# Altium footprint library User.PcbLib: 317 footprints (part 20 of 20)
Each footprint in its own frame and in the unit in brackets; x right, y up, seen from the top. Pads: shape width x height; smd on the part's side, far side on the other; paste and mask are expansions set on the pad; w line width, h text height; cw(c..) or ccw(c..) is an arc to the next point about the centre after c.
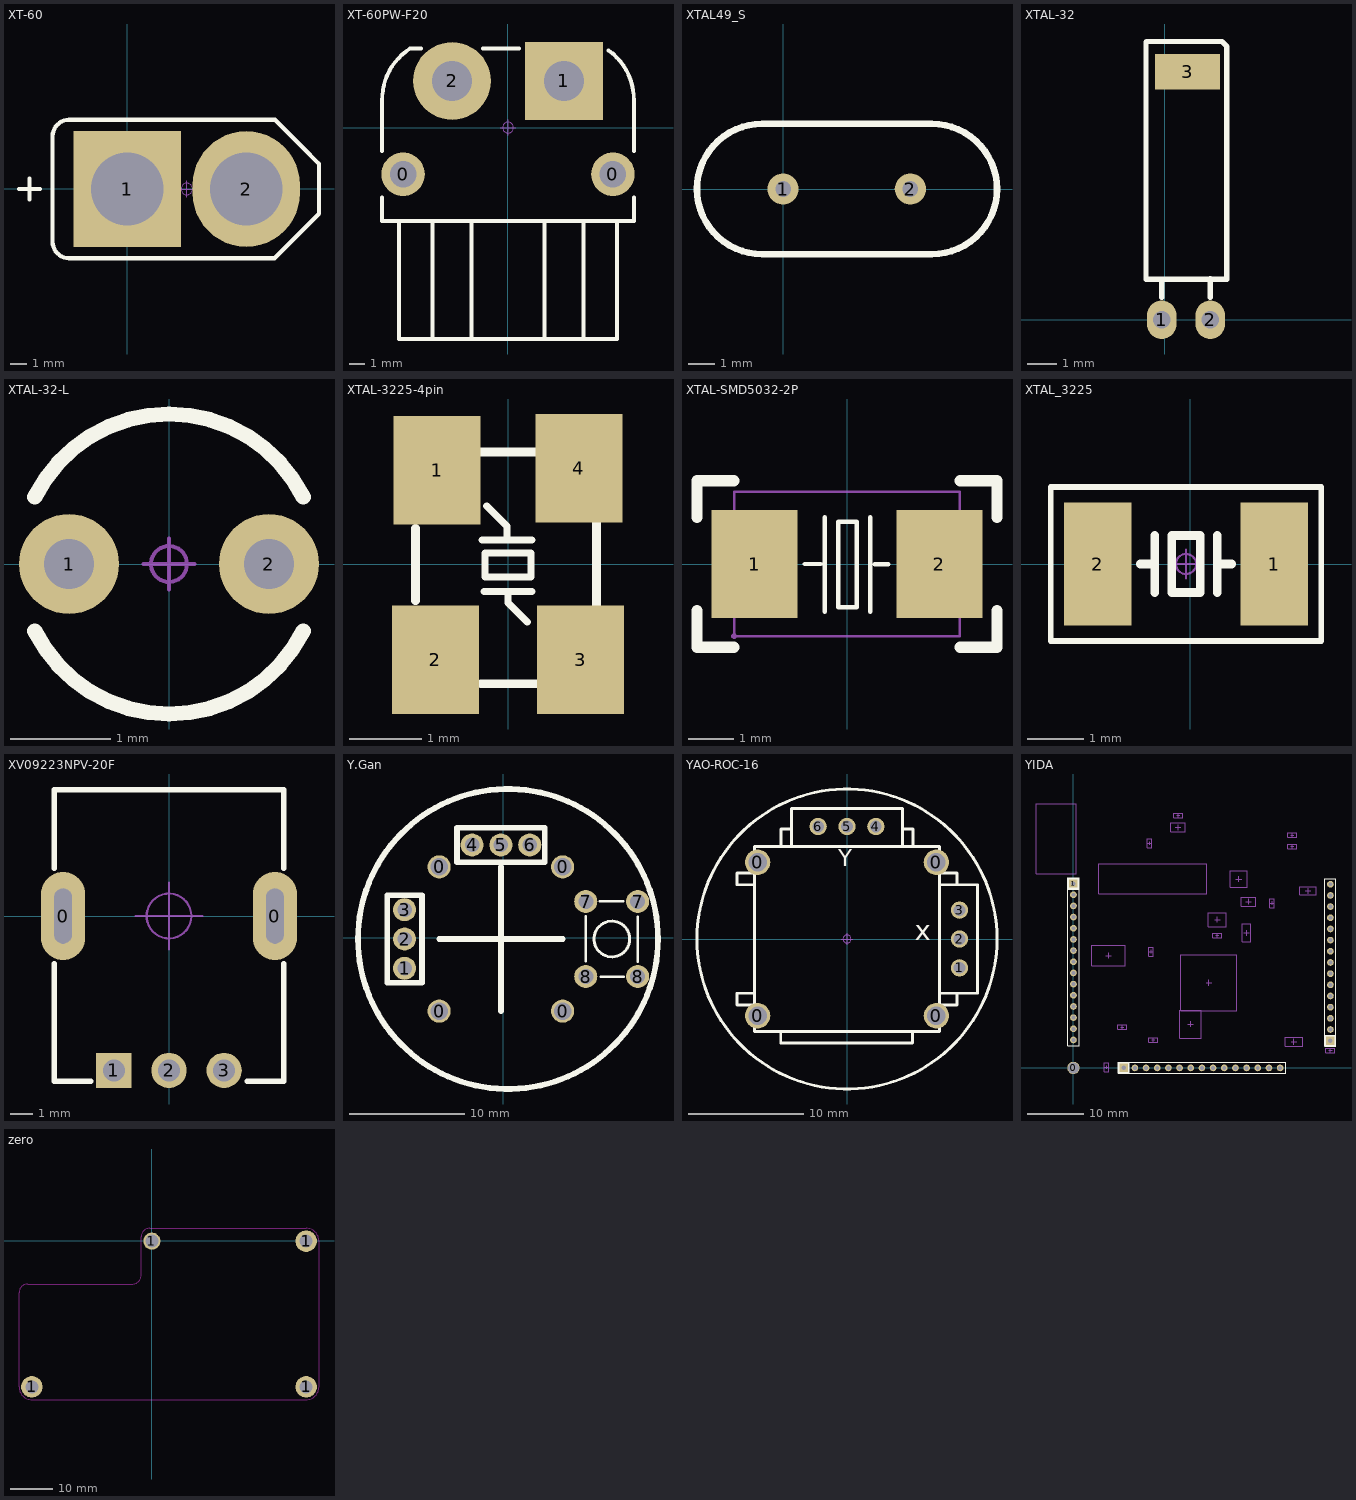
[diagram p19: the footprints below, top view; thin cyan lines are the x and y axes]

## XT-60 [mm]
pads (2):
  rect 6.5x7 hole 4.4: 1(0,-0.025)
  oval 6.5x7 hole 4.4: 2(7.2,-0.025)
Top Overlay:
  lines w0.254: -6.56,-0.025 -5.29,-0.025 ; -5.925,-0.66 -5.925,0.61 ; -4.528,-3.216 ccw(c-3.528,-3.216) -3.528,-4.216 8.909,-4.216 11.6,-1.525 11.6,1.5 10.585,2.515 8.934,4.166 -3.528,4.166 ccw(c-3.528,3.166) -4.528,3.166 -4.528,-3.216
Mechanical 15:
  circle w0.05: c3.6,-0.025 r0.35
  lines w0.05: 3.1,-0.025 4.1,-0.025 ; 3.6,-0.525 3.6,0.475
3D body "TX60-LI-S.STEP": height 16.05, standoff -2.25, extent -4.4,-4.125 11.6,4.075

## XT-60PW-F20 [mm]
pads (4):
  round 2.8 hole 1.7: 0(-6.75,-3) 0(6.75,-3)
  rect 5x5 hole 2.6: 1(3.6,3)
  round 5 hole 2.6: 2(-3.6,3)
Top Overlay:
  lines w0.254: -8.1,-4.5 -8.1,-6 8.1,-6 8.1,-4.5 ; -8.1,-1.5 -8.1,1.738 cw(c-4.2,1.8) -6.294,5.091 ; -7,-6 -7,-13.6 7,-13.6 7,-6 ; -6.294,5.1 -5.6,5.1 ; -4.85,-13.6 -4.85,-6 ; -2.35,-13.6 -2.35,-6 ; -1.6,5.1 0.7,5.1 ; 2.35,-13.6 2.35,-6 ; 4.85,-13.6 4.85,-6 ; 6.477,4.967 cw(c4.2,1.8) 8.1,1.738 ; 8.1,-1.5 8.1,1.792 ; 0,-6 ccw(c0,-6) 0,-6
Mechanical 15:
  circle w0.05: c0,0 r0.35
  lines w0.05: -0.5,0 0.5,0 ; 0,-0.5 0,0.5
3D body "TX60PW-F20.STEP": height 8.65, standoff -2.35, extent -8,-13.6 8,5.02

## XTAL49_S [mm]
pads (2):
  round 1.2 hole 0.6: 1(0,0) 2(4.88,0)
Top Overlay:
  lines w0.254: -3.3,0 ccw(c-0.8,0) -0.8,-2.5 5.7,-2.5 ccw(c5.7,0) 8.2,0 ccw(c5.7,0) 5.7,2.5 -0.8,2.5 ccw(c-0.8,0) -3.3,0
Mechanical 13:
  lines w0.025: -3.3,0 cw(c-0.8,0) -0.8,2.5 5.7,2.5 cw(c5.7,0) 8.2,0 cw(c5.7,0) 5.7,-2.5 -0.8,-2.5 cw(c-0.8,0) -3.3,0
3D body "SW3dPS-HP49US.STEP": height 4, standoff -3.5, extent -3.225,-2.32 8.125,2.33

## XTAL-32 [mm]
pads (3):
  oval 1x1.3 hole 0.6: 1(-0.1,0) 2(1.54,0)
  rect 2.2x1.2 smd: 3(0.775,8.382)
Top Overlay:
  lines w0.178: -0.1,0.762 -0.1,1.37 ; 1.54,0.762 1.54,1.386 ; -0.63,1.37 -0.63,8.77 -0.63,9.376 -0.608,9.398 1.932,9.398 2.1,9.23 2.1,8.77 2.1,1.37 -0.63,1.37
3D body "XTAL D2X6.STEP": height 2, standoff -1, extent -0.289,-0.229 1.711,7.471

## XTAL-32-L [mm]
pads (2):
  round 1 hole 0.5: 1(-1,0) 2(1,0)
Top Overlay:
  lines w0.152: -1.342,-0.671 ccw(c0,0) 1.342,-0.671 ; -1.342,0.671 cw(c0,0) 1.342,0.671
Mechanical 15:
  circle w0.04: c0,0 r0.18
  lines w0.04: -0.254,0 0.254,0 ; 0,-0.254 0,0.254
3D body "OSC-3x8-LI.STEP": height 9.1, standoff -2.5, extent -1.5,-1.5 1.5,1.5

## XTAL-3225-4pin [mm]
pads (4):
  rect 1.2x1.5 smd: 1(-0.978,1.295) 2(-1.003,-1.321) 3(1.003,-1.321) 4(0.978,1.321)
Top Overlay:
  lines w0.1: -0.356,0.33 0.33,0.33 ; -0.33,-0.381 0.33,-0.381 ; -0.292,0.8 -0.013,0.521 -0.013,0.33 ; 0,-0.381 0,-0.533 0.267,-0.8 ; -0.318,-0.178 -0.318,0.152 0.318,0.152 0.318,-0.178 -0.318,-0.178
  lines w0.12: -1.278,-0.505 -1.278,0.495 ; -0.378,-1.655 0.422,-1.655 ; -0.378,1.545 0.422,1.545 ; 1.222,-0.605 1.222,0.595
3D body "XTAL-3225.STEP": height 0.8, standoff 0, extent -1.268,-1.651 1.232,1.549

## XTAL-SMD5032-2P [mil]
pads (2):
  rect 74.8x94.5 smd mask+2: 1(-80.7,0) 2(80.7,0)
Top Overlay:
  lines w3.9: -37,0 -23,0 ; -19.25,-41.75 -19.25,40.95 ; 20.15,-41.75 20.15,40.95 ; 24.3,-0.4 36.1,-0.4 ; -7.45,-37.75 -7.45,37.05 8.35,37.05 8.35,-37.75 -7.45,-37.75
  lines w10: -130.9,-40.78 -130.9,-72.8 -98.88,-72.8 ; -130.9,40.78 -130.9,72.8 -98.88,72.8 ; 98.88,-72.8 130.9,-72.8 130.9,-40.78 ; 98.88,72.8 130.9,72.8 130.9,40.78
Mechanical 15:
  region: -96,-63 -96,-62.01 -97.41,-60.6 -99.39,-60.6 -100.8,-62.01 -100.8,-63 -100.8,-63.99 -99.39,-65.4 -97.41,-65.4 -96,-63.99
  region: 98.4,39.4 98.4,-39.4 47.2,-39.4 47.2,39.4
  region: -47.2,39.4 -47.2,-39.4 -98.4,-39.4 -98.4,39.4
  lines w2: -98.4,-63 -98.4,63 98.4,63 98.4,-63 -98.4,-63
3D body "XTAL-Crystal SMD 5X3.2.STEP": height 39.37, standoff 0, extent -97.98,-62.99 98.88,62.99

## XTAL_3225 [mm]
pads (2):
  rect 1.2x2.2 smd: 1(1.498,0) 2(-1.65,0)
Top Overlay:
  lines w0.1: -2.489,-1.372 2.337,-1.372 2.337,1.372 -2.489,1.372 -2.489,-1.372
  lines w0.152: -0.889,0 -0.635,0 ; -0.635,-0.508 -0.635,0.508 ; 0.483,-0.508 0.483,0.508 ; 0.483,0 0.737,0 ; -0.33,-0.508 0.178,-0.508 0.178,0.508 -0.33,0.508 -0.33,-0.508
Mechanical 15:
  circle w0.04: c-0.076,0 r0.18
  lines w0.04: -0.33,0 0.178,0 ; -0.076,-0.254 -0.076,0.254
3D body "OSC 3225-4.STEP": height 0.7, standoff -0.02, extent -1.676,-1.25 1.524,1.25

## XV09223NPV-20F [mm] "长9.85mm，宽11.55mm，高20mm"
pads (5):
  oval 2x4 hole 0.8 slot 2.5 at 90 deg: 0(-4.8,0) 0(4.8,0)
  rect 1.6x1.6 hole 1: 1(-2.5,-7)
  round 1.6 hole 1: 2(0,-7) 3(2.5,-7)
Top Overlay:
  lines w0.254: -5.207,-2.159 -5.207,-7.493 -3.556,-7.493 ; -5.207,2.159 -5.207,5.715 5.207,5.715 5.207,2.159 ; 3.556,-7.493 5.207,-7.493 5.207,-2.159
Mechanical 15:
  circle w0.1: c0,0 r1.016
  lines w0.1: -1.524,0 1.524,0 ; 0,-1.524 0,1.524
3D body "XV09223NPV-20F.STEP": height 20, standoff -3.8, extent -4.925,-7.15 4.925,5.5

## Y.Gan [mm]
pads (14):
  round 2 hole 1.5: 0(-5.55,-6.35) 0(-5.55,6.15) 0(5.15,-6.35) 0(5.15,6.15)
  round 2 hole 1.25: 1(-8.55,-2.64) 2(-8.55,-0.1) 3(-8.55,2.44) 4(-2.7,8.05) 5(-0.2,8.05) 6(2.3,8.05)
  round 2 hole 1.3: 7(7.153,3.149) 7(11.653,3.149) 8(7.153,-3.351) 8(11.653,-3.351)
Top Overlay:
  circle w0.5: c0.414,-0.1 r13
  circle w0.254: c9.414,-0.1 r1.547
  lines w0.2: 7.158,-2.035 7.158,1.877 ; 8.378,3.172 10.41,3.172 ; 8.428,-3.381 10.46,-3.381 ; 11.654,-2.06 11.654,1.852
  lines w0.5: -5.55,-0.1 -0.2,-0.1 ; -0.2,-6.35 -0.2,-0.1 ; -0.2,6.15 -0.2,-0.1 ; 5.15,-0.1 -0.2,-0.1 ; -10.05,-3.9 -7.05,-3.9 -7.05,3.7 -10.05,3.7 -10.05,-3.9 ; -4,6.55 -4,9.55 3.6,9.55 3.6,6.55 -4,6.55

## YAO-ROC-16 [mm] "摇杆电位器，长16mm，宽16mm，高12.2mm"
pads (10):
  round 2.2 hole 1.6: 0(-7.75,-6.65) 0(-7.75,6.65) 0(7.75,-6.65) 0(7.75,6.65)
  round 1.5 hole 1: 1(9.75,-2.5) 2(9.75,0) 3(9.75,2.5) 4(2.5,9.75) 5(0,9.75) 6(-2.5,9.75)
Top Overlay:
  circle w0.254: c0,0 r13
  lines w0.254: -8,-5.715 -9.525,-5.715 -9.525,-4.699 -8,-4.699 ; -8,4.699 -9.525,4.699 -9.525,5.715 -8,5.715 ; -5.741,-8.028 -5.741,-9.017 5.689,-9.017 5.689,-8.027 5.663,-8.053 ; -5.715,8 -5.715,9.525 -4.8,9.525 ; -4.8,8 -4.8,11.3 4.8,11.3 4.8,8 ; 4.8,9.144 4.8,8 ; 4.8,9.525 5.715,9.525 5.715,8 ; 4.826,8.026 4.8,8 ; 8,-5.715 9.525,-5.715 9.525,-4.699 ; 8,-4.699 9.525,-4.699 ; 8,4.699 9.525,4.699 ; 8,5.715 9.525,5.715 9.525,4.699 ; 9.525,-4.699 11.3,-4.699 11.301,-2.425 ; 9.525,4.699 11.303,4.699 11.302,2.324 11.301,-2.425 ; 11.301,-2.425 11.301,-2.425 ; -8,-8 -8,8 8,8 8,-8 -8,-8
  text "Y" at -0.762,5.842 h2.5
  text "x" at 5.867,-0.737 h3
Mechanical 15:
  circle w0.05: c0,0 r0.35
  lines w0.05: -0.5,0 0.5,0 ; 0,-0.5 0,0.5
3D body "ROC16.STEP": height 29.36, standoff -3.65, extent -12.5,-12.5 12.5,12.5

## YIDA [mm]
pads (46):
  round 2.2 hole 2: 0(0,-0.025)
  rect 1.5x1.5 hole 0.8: 1(0,32.975) 16(9,-0.026) 31(46,4.85)
  round 1.2 hole 0.7: 2(0,30.975) 3(0,28.975) 4(0,26.975) 5(0,24.975) 6(0,22.975) 7(0,20.975) 8(0,18.975) 9(0,16.975) 10(0,14.975) 11(0,12.975) 12(0,10.975) 13(0,8.975) 14(0,6.975) 15(0,4.975) 17(11,-0.026) 18(13,-0.026) 19(15,-0.026) 20(17,-0.026) 21(19,-0.026) 22(21,-0.026) 23(23,-0.026) 24(25,-0.026) 25(27,-0.026) 26(29,-0.026) 27(31,-0.026) 28(33,-0.026) 29(35,-0.026) 30(37,-0.026) 32(46,6.85) 33(46,8.85) 34(46,10.85) 35(46,12.85) 36(46,14.85) 37(46,16.85) 38(46,18.85) 39(46,20.85) 40(46,22.85) 41(46,24.85) 42(46,26.85) 43(46,28.85) 44(46,30.85) 45(46,32.85)
Top Overlay:
  region: -1,33.975 -1,31.975 1,31.975 1,33.975
  rectangle: 8,-1.026 10,0.974
  region: 47,3.85 47,5.85 45,5.85 45,3.85
  lines w0.2: -1,31.975 1,31.975 ; 10,-1.026 10,0.974 ; 45,5.85 47,5.85 ; -1,3.975 -1,33.975 1,33.975 1,3.975 -1,3.975 ; 8,-1.026 8,0.974 38,0.974 38,-1.026 8,-1.026 ; 45,3.85 47,3.85 47,33.85 45,33.85 45,3.85
Mechanical 2:
  text "+" at 42.701,0.892 h1
Mechanical 15:
  lines w0.1: 5.622,0.105 6.222,0.105 ; 5.778,20.069 6.778,20.069 ; 5.922,-0.198 5.922,0.402 ; 6.278,19.569 6.278,20.569 ; 8.439,7.293 9.039,7.293 ; 8.742,6.993 8.742,7.593 ; 13.319,40.193 13.919,40.193 ; 13.588,20.799 14.188,20.799 ; 13.619,39.896 13.619,40.496 ; 13.888,20.502 13.888,21.102 ; 13.983,4.975 14.583,4.975 ; 14.286,4.675 14.286,5.275 ; 18.249,43.031 19.249,43.031 ; 18.472,45.165 19.072,45.165 ; 18.749,42.531 18.749,43.531 ; 18.775,44.865 18.775,45.465 ; 20.475,7.827 21.475,7.827 ; 20.975,7.327 20.975,8.327 ; 23.75,15.225 24.75,15.225 ; 24.25,14.725 24.25,15.725 ; 25.274,26.52 26.274,26.52 ; 25.457,23.676 26.057,23.676 ; 25.76,23.376 25.76,23.976 ; 25.774,26.02 25.774,27.02 ; 29.095,33.785 30.095,33.785 ; 29.595,33.285 29.595,34.285 ; 30.481,24.133 31.481,24.133 ; 30.873,29.747 31.873,29.747 ; 30.981,23.633 30.981,24.633 ; 31.373,29.247 31.373,30.247 ; 35.264,29.467 35.864,29.467 ; 35.564,29.17 35.564,29.77 ; 38.868,39.627 39.468,39.627 ; 38.868,41.659 39.468,41.659 ; 38.976,4.652 39.976,4.652 ; 39.171,39.327 39.171,39.927 ; 39.171,41.359 39.171,41.959 ; 39.476,4.152 39.476,5.152 ; 41.502,31.675 42.502,31.675 ; 42.002,31.175 42.002,32.175 ; 45.707,3.102 46.307,3.102 ; 46.004,2.802 46.004,3.402 ; -6.7,34.725 -6.7,47.225 0.5,47.225 0.5,34.725 -6.7,34.725 ; 3.278,18.219 3.278,21.919 9.278,21.919 9.278,18.219 3.278,18.219 ; 4.548,31.191 23.848,31.191 23.848,36.491 4.548,36.491 4.548,31.191 ; 5.522,-0.695 5.522,0.905 6.322,0.905 6.322,-0.695 5.522,-0.695 ; 7.942,6.893 9.542,6.893 9.542,7.693 7.942,7.693 7.942,6.893 ; 13.219,39.393 14.019,39.393 14.019,40.993 13.219,40.993 13.219,39.393 ; 13.486,4.575 13.486,5.375 15.086,5.375 15.086,4.575 13.486,4.575 ; 13.488,19.999 13.488,21.599 14.288,21.599 14.288,19.999 13.488,19.999 ; 17.449,42.231 20.049,42.231 20.049,43.831 17.449,43.831 17.449,42.231 ; 17.975,44.765 17.975,45.565 19.575,45.565 19.575,44.765 17.975,44.765 ; 19.075,5.327 19.075,10.327 22.875,10.327 22.875,5.327 19.075,5.327 ; 19.25,10.225 19.25,20.225 29.25,20.225 29.25,10.225 19.25,10.225 ; 24.174,25.27 27.374,25.27 27.374,27.77 24.174,27.77 24.174,25.27 ; 24.96,23.276 26.56,23.276 26.56,24.076 24.96,24.076 24.96,23.276 ; 28.07,32.285 31.07,32.285 31.07,35.285 28.07,35.285 28.07,32.285 ; 30.073,28.947 30.073,30.547 32.673,30.547 32.673,28.947 30.073,28.947 ; 30.221,22.523 30.221,25.743 31.741,25.743 31.741,22.523 30.221,22.523 ; 35.164,28.667 35.164,30.267 35.964,30.267 35.964,28.667 35.164,28.667 ; 37.876,3.852 41.076,3.852 41.076,5.452 37.876,5.452 37.876,3.852 ; 38.371,39.227 39.971,39.227 39.971,40.027 38.371,40.027 38.371,39.227 ; 38.371,41.259 39.971,41.259 39.971,42.059 38.371,42.059 38.371,41.259 ; 40.502,30.975 40.502,32.375 43.502,32.375 43.502,30.975 40.502,30.975 ; 45.204,2.702 46.804,2.702 46.804,3.502 45.204,3.502 45.204,2.702
3D body "M3x7.STEP": height 7.05, standoff 0.05, extent -2.698,-2.375 2.698,2.325
3D body "User Library-0603 SMD Capacitor.STEP": height -7.7, standoff -8, extent 41.386,36.295 42.186,37.895
3D body "User Library-0603 SMD Capacitor.STEP": height 10.3, standoff 10, extent 38.821,29.93 39.621,31.53
3D body "User Library-0603 SMD Capacitor.STEP": height -7.7, standoff -8, extent 42.757,5.307 43.557,6.907
3D body "Capacitor 1206 SMD1.step": height -7, standoff -8, extent 41.19,30.433 42.791,33.633
3D body "User Library-0603 SMD Capacitor.STEP": height -7.7, standoff -8, extent 42.709,9.051 43.509,10.651
3D body "User Library-0603 SMD Capacitor.STEP": height -7.7, standoff -8, extent 9.382,40.521 10.982,41.321
3D body "User Library-0603 SMD Capacitor.STEP": height -7.7, standoff -8, extent 37.413,10.324 39.014,11.124
3D body "User Library-0603 SMD Capacitor.STEP": height -7.7, standoff -8, extent 21.269,40.521 22.869,41.321
3D body "User Library-0603 SMD Capacitor.STEP": height -7.7, standoff -8, extent 17.525,40.524 19.125,41.324
3D body "User Library-0603 SMD Capacitor.STEP": height -7.7, standoff -8, extent 5.613,40.524 7.213,41.324
3D body "User Library-0603 SMD Capacitor.STEP": height 10.3, standoff 10, extent 32.092,31.52 32.892,33.12
3D body "User Library-0805 SMD Capacitor.STEP": height -7.22, standoff -8, extent 11.128,42.835 13.128,44.085
3D body "User Library-0603 SMD Capacitor.STEP": height -7.7, standoff -8, extent 3.096,44.383 4.696,45.183
3D body "User Library-0603 SMD Capacitor.STEP": height 10.3, standoff 10, extent 31.037,20.458 32.637,21.258
3D body "User Library-0603 SMD Capacitor.STEP": height 10.3, standoff 10, extent 29.45,4.85 30.25,6.45
3D body "User Library-0603 SMD Capacitor.STEP": height 10.3, standoff 10, extent 31.037,26.833 32.637,27.633
3D body "User Library-0603 SMD Capacitor.STEP": height 10.3, standoff 10, extent 22.378,25.76 23.178,27.36
3D body "User Library-0603 SMD Capacitor.STEP": height 10.3, standoff 10, extent 28.347,25.734 29.147,27.334
3D body "User Library-0603 SMD Capacitor.STEP": height -7.7, standoff -8, extent 5.47,19.671 7.07,20.471
3D body "User Library-0603 SMD Capacitor.STEP": height 10.3, standoff 10, extent 16.367,4.809 17.167,6.409
3D body "DO-214AC.STEP": height -5.6, standoff -8, extent 35.281,25.821 37.981,30.421
3D body "SOD123.STEP": height 11.27, standoff 10, extent 29.523,28.947 33.223,30.547
3D body "SOD123.STEP": height -6.73, standoff -8, extent 16.899,42.231 20.6,43.831
3D body "LQFP-64-10x10.STEP": height 11.62, standoff 9.99, extent 18.179,9.151 30.322,21.295
3D body "XH2.54-4-H.STEP": height 15.8, standoff 6.75, extent -7.3,34.714 0.8,47.235
3D body "HDR2.0-LI-15P.STEP": height -1.9, standoff -11.2, extent -1,3.975 1,33.975
3D body "HDR2.0-LI-15P.STEP": height -1.9, standoff -11.2, extent 45,3.975 47,33.975
3D body "HDR2.0-LI-2x3P.STEP": height 16.5, standoff 7.2, extent 5,1.974 11,5.974
3D body "RESC1608(0603).STEP": height -7.62, standoff -8, extent 13.219,39.393 14.018,40.993
3D body "RESC1608(0603).STEP": height 10.38, standoff 10, extent 35.164,28.667 35.964,30.268
3D body "RESC1608(0603).STEP": height -7.62, standoff -8, extent 17.975,44.765 19.575,45.564
3D body "RESC1608(0603).STEP": height -7.62, standoff -8, extent 38.371,41.259 39.971,42.059
3D body "RESC1608(0603).STEP": height -7.62, standoff -8, extent 38.371,39.227 39.971,40.027
3D body "1206-4Way.STEP": height 10.5, standoff 10, extent 37.876,3.852 41.076,5.452
3D body "RESC1608(0603).STEP": height 10.38, standoff 10, extent 45.204,2.702 46.804,3.502
3D body "RESC1608(0603).STEP": height 10.38, standoff 10, extent 5.523,-0.695 6.322,0.905
3D body "RESC1608(0603).STEP": height 10.38, standoff 10, extent 7.942,6.893 9.542,7.693
3D body "RESC1608(0603).STEP": height 10.38, standoff 10, extent 13.488,19.999 14.288,21.6
3D body "LED3528.step": height 11.6, standoff 9.8, extent 41.485,-0.838 44.985,1.962
3D body "RESC1608(0603).STEP": height 10.38, standoff 10, extent 24.96,23.276 26.56,24.076
3D body "SWITCH-PB-1.STEP": height 12.5, standoff 9.85, extent 2.278,18.219 10.278,21.92
3D body "SOT23-5R.STEP": height 11.3, standoff 10, extent 40.512,30.158 43.512,33.159
3D body "HEADER-FPC-ZIF-SMD-Horizontal-0.5-30.stp": height 8.05, standoff 5.8, extent 4.648,30.331 23.748,36.83
3D body: height 12, standoff 10.2, extent 1.117,28.075 27.279,47.075
3D body "USB Type-C_A.STEP": height -4.75, standoff -8.85, extent 44.888,35.897 52.788,44.837
3D body "MSOP-10.STEP": height 11.25, standoff 10, extent 28.07,31.399 31.07,36.299
3D body "XTAL ABS07.STEP": height 10.91, standoff 10, extent 30.222,22.523 31.741,25.743
3D body "XTAL-SMD-3225.step": height 10.6, standoff 10, extent 24.174,25.27 27.374,27.77
3D body "HDR2.0-LI-15P.STEP": height -1.9, standoff -11.2, extent 8,-1.026 38,0.974
3D body "RESC1608(0603).STEP": height -7.62, standoff -8, extent 13.486,4.575 15.086,5.375
3D body "SOIC8.STEP": height -6.25, standoff -8, extent 17.969,5.327 23.981,10.327
3D body "HDR2.0-LI-2x3P.STEP": height 16.5, standoff 7.2, extent 33.809,34.164 39.809,38.164
3D body "HDR2.0-M-LI-15P.STEP": height 5.5, standoff -2.27, extent -1,3.975 1,33.975
3D body "HDR2.0-M-LI-15P.STEP": height 5.5, standoff -2.27, extent 8,-1.026 38,0.974
3D body "HDR2.0-M-LI-15P.STEP": height 5.5, standoff -2.27, extent 45,3.85 47,33.85
3D body: height 10, standoff 8, extent -2,-2.025 48,47.975

## zero [mm]
pads (4):
  round 5 hole 3: 1(-27.924,-34.051) 1(36.076,-34.051) 1(36.076,-0.051)
  round 4 hole 3: 1(0.076,-0.051)
Keep-Out Layer:
  lines w0.254: -30.924,-34.051 ccw(c-27.924,-34.051) -27.924,-37.051 36.076,-37.051 ccw(c36.076,-34.051) 39.076,-34.051 39.076,-0.051 ccw(c36.076,-0.051) 36.076,2.949 -0.424,2.949 ccw(c-0.424,0.949) -2.424,0.949 -2.424,-8.051 cw(c-4.424,-8.051) -4.424,-10.051 -28.924,-10.051 ccw(c-28.924,-12.051) -30.924,-12.051 -30.924,-34.051
3D body "M3x5.STEP": height 19.25, standoff 14.25, extent -2.622,-2.401 2.774,2.299
3D body "M3x5.STEP": height 19.25, standoff 14.25, extent -30.622,-36.401 -25.226,-31.701
3D body "M3x5.STEP": height 19.25, standoff 14.25, extent 33.378,-36.401 38.774,-31.701
3D body "M3x5.STEP": height 19.25, standoff 14.25, extent 33.378,-2.401 38.774,2.299
3D body: height 14, standoff 13, extent -30.924,-37.051 39.076,2.972